# Altium footprint library SRAD_SAC_PcbLib.PcbLib: 33 footprints (part 3 of 3)
Each footprint in its own frame and in the unit in brackets; x right, y up, seen from the top. Pads: shape width x height; smd on the part's side, far side on the other; paste and mask are expansions set on the pad; w line width, h text height; cw(c..) or ccw(c..) is an arc to the next point about the centre after c.
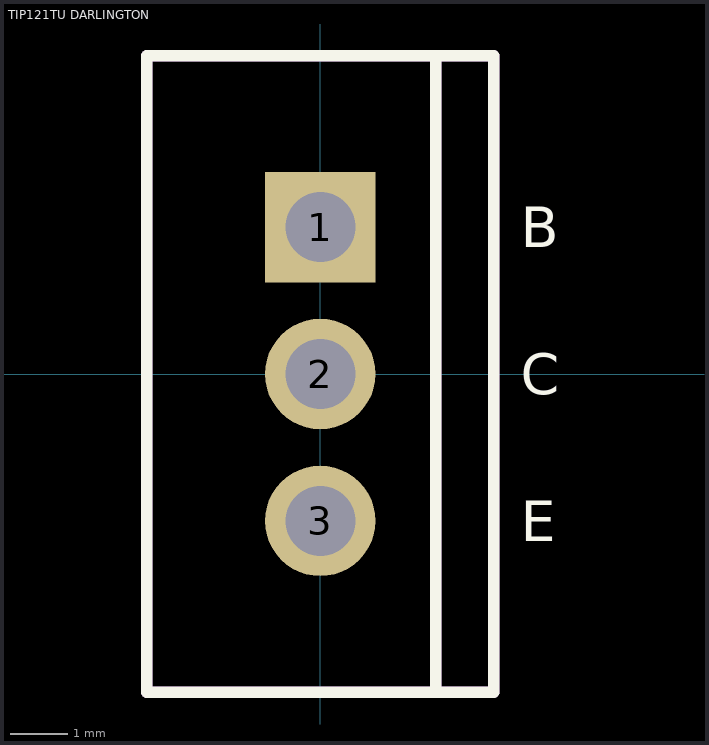
[diagram p2: the footprint, top view; thin cyan lines are the x and y axes]

## TIP121TU DARLINGTON [mm]
pads (3):
  rect 1.91x1.91 hole 1.21: 1(0,2.54)
  round 1.91 hole 1.21: 2(0,0) 3(0,-2.54)
Top Overlay:
  lines w0.2: 2,-5.5 2,5.5 ; -3,-5.5 -3,5.5 3,5.5 3,-5.5 -3,-5.5
  text "E" at 3.467,-2.89 h0.7
  text "C" at 3.467,-0.35 h0.7
  text "B" at 3.467,2.19 h0.7
Top Assembly:
  lines w0.2: 2,-5.5 2,5.5 ; -3,-5.5 -3,5.5 3,5.5 3,-5.5 -3,-5.5
  text ".Designator" at -3.499,-0.233 h0.7
3D body "TIP121.step": height 19.71, standoff -6.48, extent -1.85,-5.157 2.748,5.257